# Altium footprint library Mine.PcbLib: 306 footprints (part 2 of 20)
Each footprint in its own frame and in the unit in brackets; x right, y up, seen from the top. Pads: shape width x height; smd on the part's side, far side on the other; paste and mask are expansions set on the pad; w line width, h text height; cw(c..) or ccw(c..) is an arc to the next point about the centre after c.
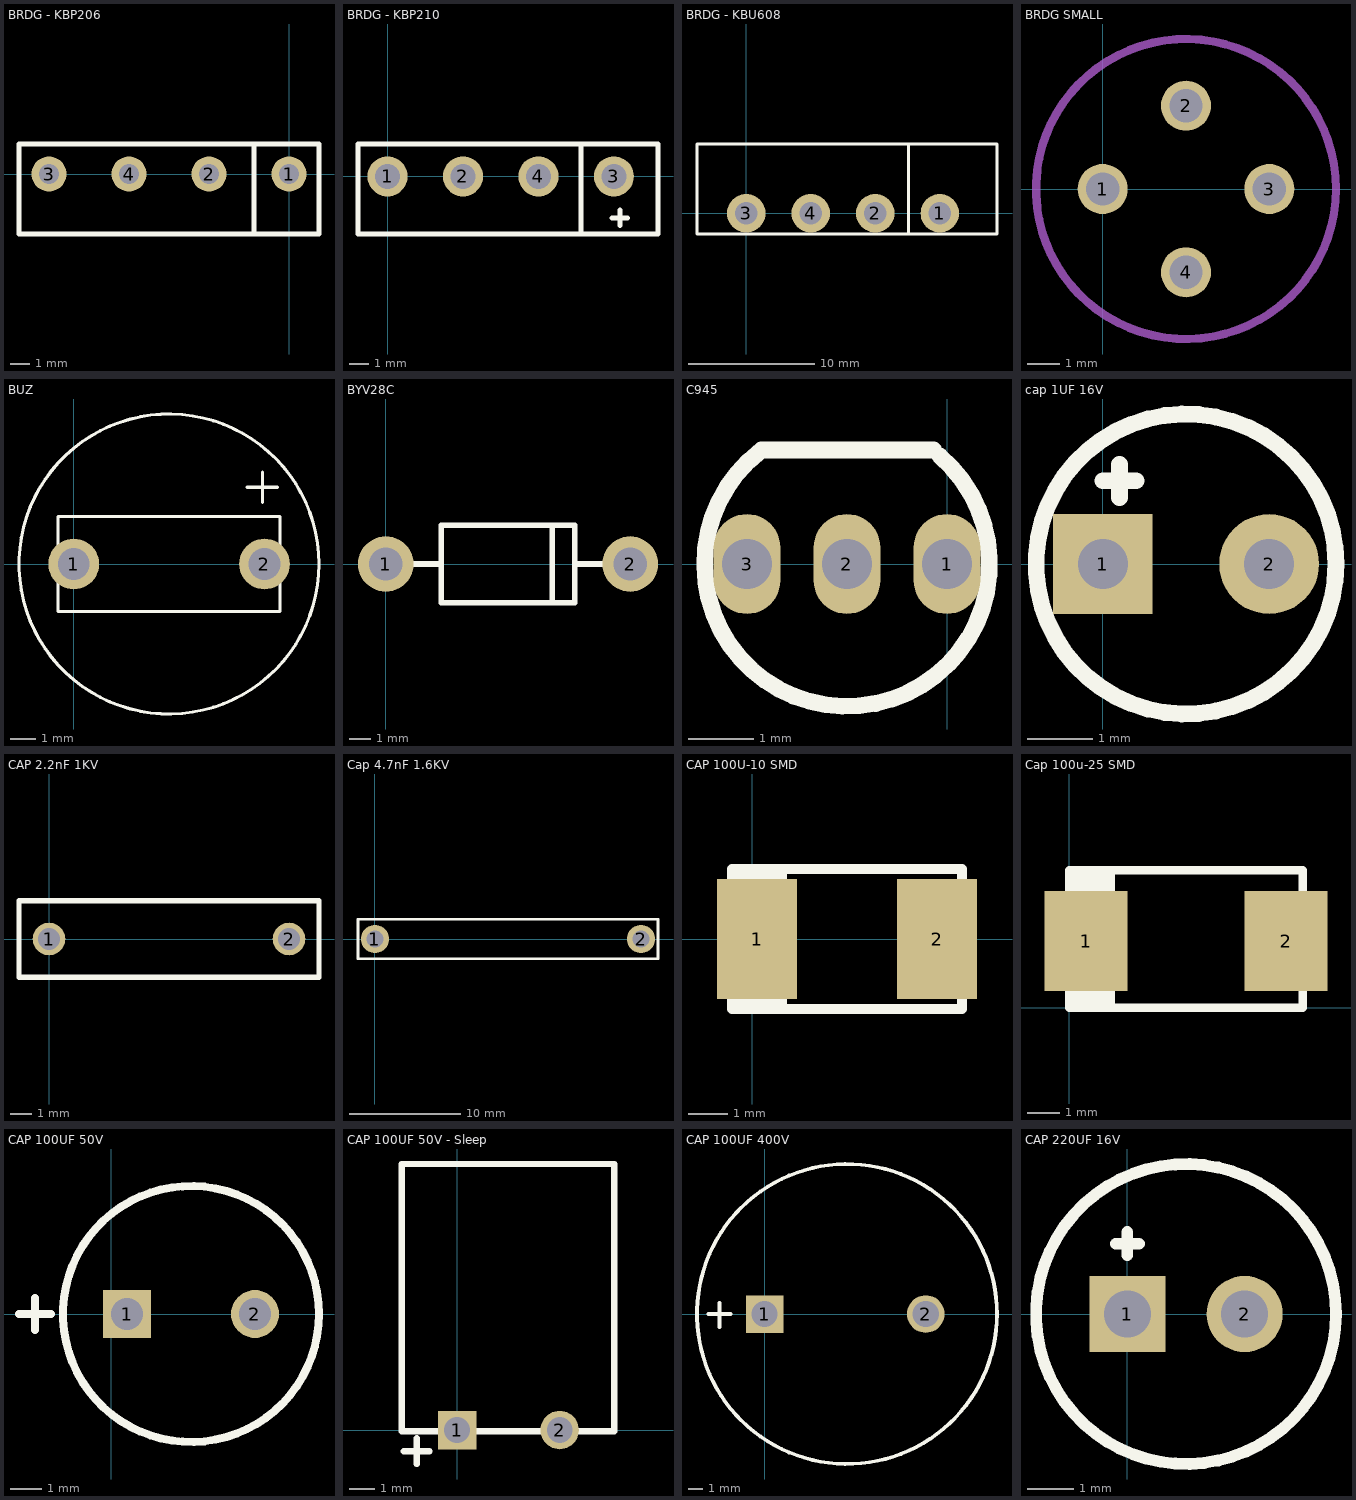
[diagram p1: the footprints below, top view; thin cyan lines are the x and y axes]

## BRDG - KBP206 [mil]
height 590.55
pads (4):
  round 70 hole 40: 1(0,0) 2(-160,0) 3(-480,0) 4(-320,0)
Top Overlay:
  lines w10: -540,-120 60,-120 ; -540,-117 -540,60 60,60 60,-117 ; -70,-120 -70,60

## BRDG - KBP210 [mil]
height 11
pads (4):
  round 80 hole 50: 1(0,0) 2(150.92,0) 3(452.76,0) 4(301.84,0)
Top Overlay:
  lines w10: -59.06,61.88 -59.06,-115.12 540.94,-115.12 540.94,61.88 ; -59.06,64.88 540.94,64.88 ; 387.32,-115.12 387.32,64.88 ; 448.82,-82.68 480.31,-82.68 ; 464.57,-98.43 464.57,-66.93

## BRDG - KBU608 [mil]
height 759.84
pads (4):
  round 120 hole 70: 1(602.36,0) 2(401.57,0) 3(0,0) 4(200.79,0)
Top Overlay:
  lines w10: 505,-64 505,215.53 ; -153.07,-64 780,-64 780,215.53 -153.07,215.53 -153.07,-64

## BRDG SMALL [mil]
pads (4):
  round 60 hole 40: 1(0,0) 2(100,100) 3(200,0) 4(100,-100)
Mechanical 1:
  circle w10: c100,0 r180

## BUZ [mil]
pads (2):
  round 80 hole 50: 1(0,0) 2(300.39,0)
Top Overlay:
  circle w5: c150,0 r236.22
  lines w5: 273,121 321,121 ; 297,97 297,145 ; -25,-75 -25,75 325,75 325,-75 -25,-75

## BYV28C [mil]
pads (2):
  round 100 hole 60: 1(0,0) 2(440,0)
Top Overlay:
  lines w10: 45,0 100,0 ; 300,-70 300,70 ; 340,0 395,0 ; 100,0 100,70 340,70 340,-70 100,-70 100,0

## C945 [mil]
pads (3):
  oval 40x60 hole 30: 1(0,0) 2(-60,0) 3(-120,0)
Top Overlay:
  lines w10: -7.88,68.35 -111.26,68.35 ccw(c-60,0) -4.4,64.87

## cap 1UF 16V [mil]
pads (2):
  rect 60x60 hole 30: 1(0,0)
  round 60 hole 30: 2(100,0)
Top Overlay:
  circle w10: c50,0 r90.14
  lines w10: 0,50 20,50 ; 10,40 10,60

## CAP 2.2nF 1KV [mil]
pads (2):
  round 60 hole 40: 1(0,0) 2(440,0)
Top Overlay:
  lines w10: -55,-70 -45,-70 495,-70 495,70 -55,70 -55,-70

## Cap 4.7nF 1.6KV [mil]
pads (2):
  round 100 hole 60: 1(0,0) 2(940,0)
Top Overlay:
  lines w10: -60,-70 -45,-70 1000,-70 1000,70 -60,70 -60,-70

## CAP 100U-10 SMD [mil]
height 106.3
pads (2):
  rect 80x120 smd: 1(5,0) 2(185,0)
Top Overlay:
  rectangle: -20,-70 35,65
  lines w10: -20,-70 210,-70 210,70 -20,70 -20,-70

## Cap 100u-25 SMD [mil]
height 118.11
pads (2):
  rect 100x120 smd: 1(20,80) 2(260,80)
Top Overlay:
  rectangle: 0,0 55,165
  lines w10: 0,0 0,165 280,165 280,0 0,0

## CAP 100UF 50V [mil]
height 472.44
pads (2):
  rect 60x60 hole 40: 1(20,0)
  round 60 hole 40 paste+0: 2(180,0)
Top Overlay:
  circle w10: c100,0 r160
  lines w10: -115,0 -75,0 ; -95,-20 -95,20

## CAP 100UF 50V - Sleep [mil]
pads (2):
  rect 60x60 hole 40: 1(0,0)
  round 60 hole 40 paste+0: 2(160,0)
Top Overlay:
  lines w10: -83,-33 -43,-33 ; -63,-53 -63,-13 ; -86,-2 245,-2 245,415 -86,415 -86,-2

## CAP 100UF 400V [mil]
pads (2):
  rect 100x100 hole 70: 1(0,0)
  round 100 hole 70: 2(430,0)
Top Overlay:
  circle w10: c220,0 r400
  lines w10: -150,0 -90,0 ; -120,-35 -120,30

## CAP 220UF 16V [mil]
height 433.07
pads (2):
  rect 65x65 hole 40: 1(0,0)
  round 65 hole 40: 2(100,0)
Top Overlay:
  circle w10: c50,0 r127.95
  lines w10: -10,60 10,60 ; 0,50 0,70